# Altium footprint library ICs And Semiconductors THD.PcbLib: 350 footprints (part 16 of 22)
Each footprint in its own frame and in the unit in brackets; x right, y up, seen from the top. Pads: shape width x height; smd on the part's side, far side on the other; paste and mask are expansions set on the pad; w line width, h text height; cw(c..) or ccw(c..) is an arc to the next point about the centre after c.
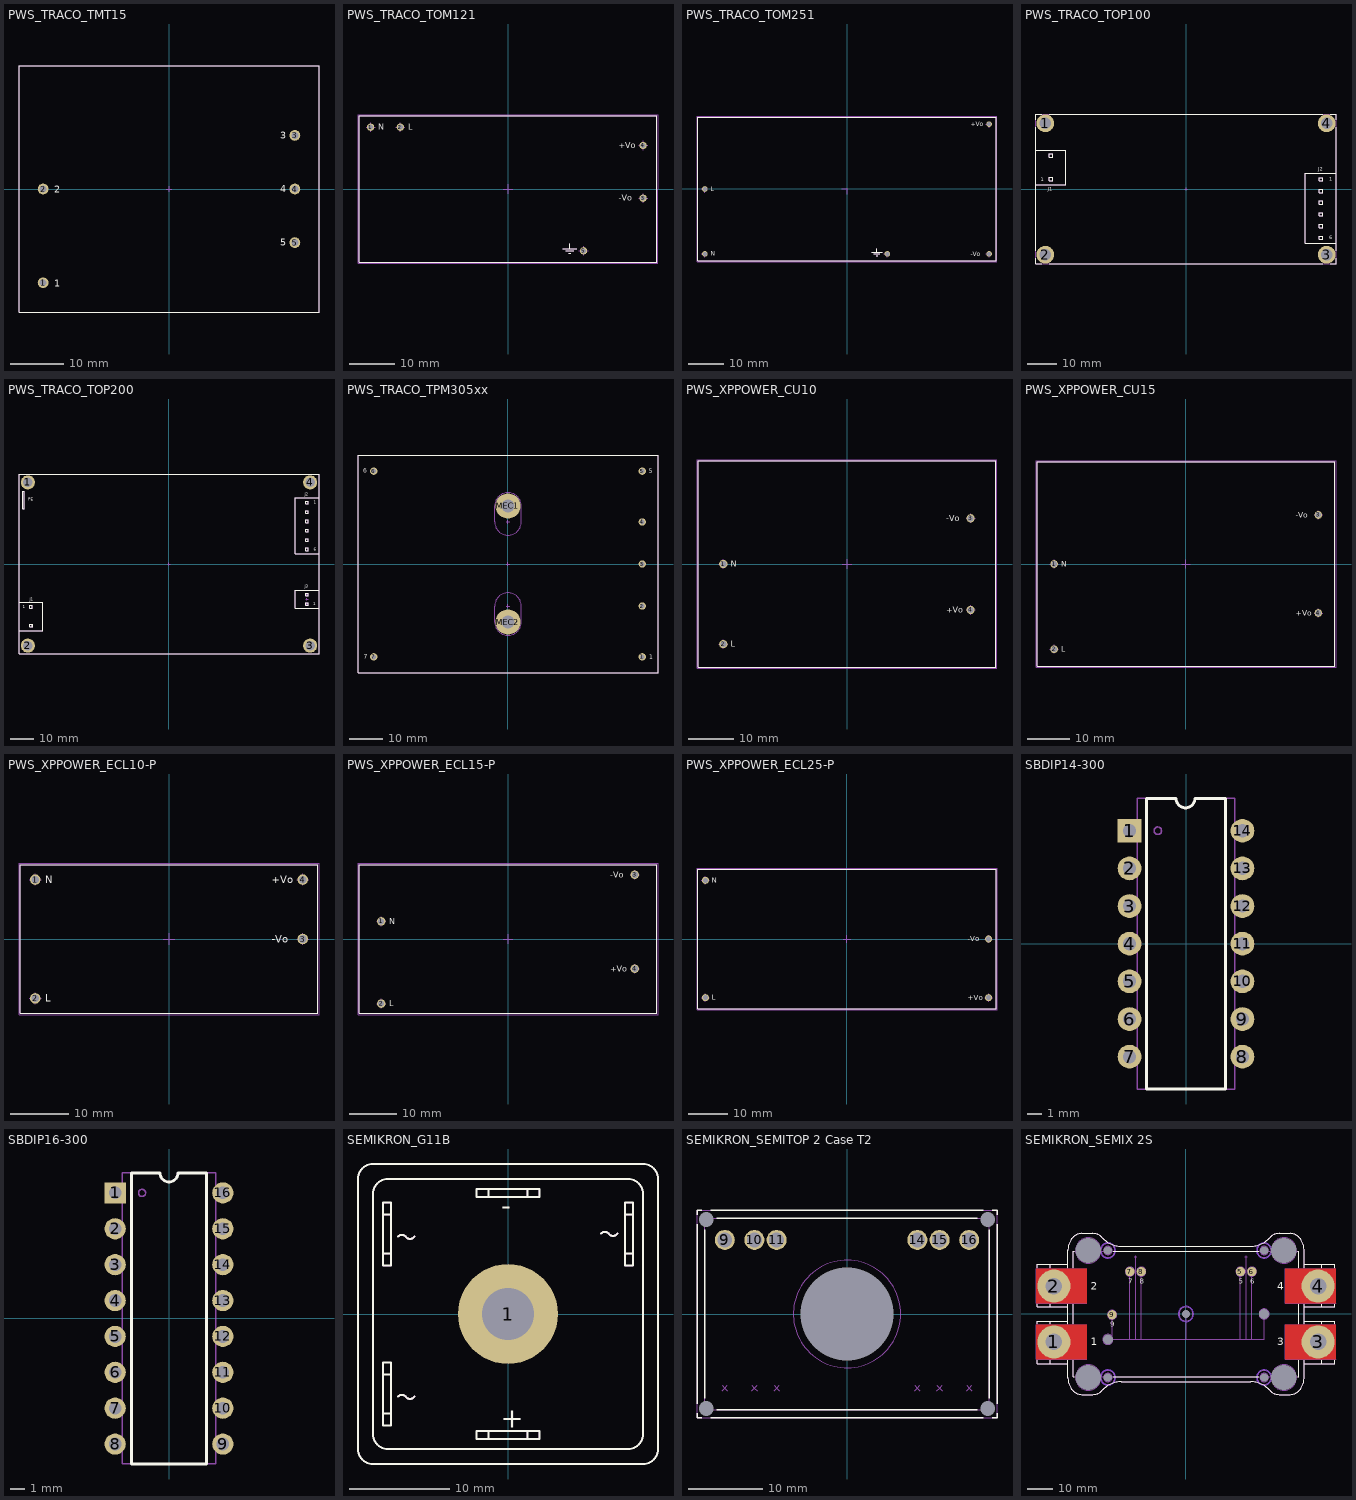
[diagram p15: the footprints below, top view; thin cyan lines are the x and y axes]

## PWS_TRACO_TMT15 [mm] "TMT  15W Model For PCB Mount, Body 55x45mm"
height 25
pads (5):
  round 2 hole 1.3: 1(-23.5,-17.5) 2(-23.5,0) 3(23.5,10) 4(23.5,0) 5(23.5,-10)
Top Overlay:
  lines w0.2: -28,-23 -28,23 28,23 28,-23 -28,-23
  text "1" at -21.42,-18.21 h1.27
  text "2" at -21.42,-0.71 h1.27
  text "5" at 20.72,-10.59 h1.27
  text "4" at 20.72,-0.59 h1.27
  text "3" at 20.72,9.41 h1.27
Notvisible:
  lines w0.1: -24,-17.5 -23.5,-17.5 ; -24,0 -23.5,0 ; -23.5,-18 -23.5,-17.5 ; -23.5,-17 -23.5,-17.5 ; -23.5,-0.5 -23.5,0 ; -23.5,0.5 -23.5,0 ; -23,-17.5 -23.5,-17.5 ; -23,0 -23.5,0 ; -0.5,0 0,0 ; 0,-0.5 0,0 ; 0,0.5 0,0 ; 0.5,0 0,0 ; 23,-10 23.5,-10 ; 23,0 23.5,0 ; 23,10 23.5,10 ; 23.5,-10.5 23.5,-10 ; 23.5,-9.5 23.5,-10 ; 23.5,-0.5 23.5,0 ; 23.5,0.5 23.5,0 ; 23.5,9.5 23.5,10 ; 23.5,10.5 23.5,10 ; 24,-10 23.5,-10 ; 24,0 23.5,0 ; 24,10 23.5,10
Mechanical 14:
  lines w0.1: -28,-23 28,-23 28,23 -28,23 -28,-23
  text "1" at -21.42,-18.21 h1.27
  text "2" at -21.42,-0.71 h1.27
  text "5" at 20.72,-10.59 h1.27
  text "4" at 20.72,-0.59 h1.27
  text "3" at 20.72,9.41 h1.27
3D body "PWS_TRACO_TMT15.stp": height 25, standoff -3.8, extent -28,-23 28,23

## PWS_TRACO_TOM121 [mm] "TOM12W Single Output Series , Body 65x32mm, Power Supply"
height 23
pads (5):
  round 1.6 hole 1.1: 1(-30,13.5) 2(-23.5,13.5) 3(29.5,-2) 4(29.5,9.5) 5(16.5,-13.5)
Top Overlay:
  lines w0.2: 12,-13 15,-13 ; 12.6,-13.5 14.4,-13.5 ; 13.3,-14 13.7,-14 ; 13.5,-13 13.5,-12 ; -32.5,-16 32.5,-16 32.5,16 -32.5,16 -32.5,-16
  text "N" at -28.325,12.91 h1.27
  text "L" at -21.825,12.91 h1.27
  text "+Vo" at 24.225,8.89 h1.27
  text "-Vo" at 24.225,-2.61 h1.27
Notvisible:
  lines w0.1: -31,13.5 -30,13.5 ; -30,12.5 -30,13.5 ; -30,14.5 -30,13.5 ; -29,13.5 -30,13.5 ; -24.5,13.5 -23.5,13.5 ; -23.5,12.5 -23.5,13.5 ; -23.5,14.5 -23.5,13.5 ; -22.5,13.5 -23.5,13.5 ; -1,0 0,0 ; 0,-1 0,0 ; 0,1 0,0 ; 1,0 0,0 ; 15.5,-13.5 16.5,-13.5 ; 16.5,-14.5 16.5,-13.5 ; 16.5,-12.5 16.5,-13.5 ; 17.5,-13.5 16.5,-13.5 ; 28.5,-2 29.5,-2 ; 28.5,9.5 29.5,9.5 ; 29.5,-3 29.5,-2 ; 29.5,-1 29.5,-2 ; 29.5,8.5 29.5,9.5 ; 29.5,10.5 29.5,9.5 ; 30.5,-2 29.5,-2 ; 30.5,9.5 29.5,9.5
Mechanical 14:
  lines w0.1: 12,-13 15,-13 ; 12.6,-13.5 14.4,-13.5 ; 13.3,-14 13.7,-14 ; 13.5,-13 13.5,-12 ; -32.5,-16 32.5,-16 32.5,16 -32.5,16 -32.5,-16
  text "N" at -28.325,12.91 h1.27
  text "L" at -21.825,12.91 h1.27
  text "+Vo" at 24.225,8.89 h1.27
  text "-Vo" at 24.225,-2.61 h1.27
Mechanical 15:
  lines w0.05: -32.75,-16.25 32.75,-16.25 32.75,16.25 -32.75,16.25 -32.75,-16.25
3D body: height 4.4, standoff -3, extent 29.101,9.101 29.9,9.899
3D body: height 4.4, standoff -3, extent 29.101,-2.399 29.9,-1.601
3D body: height 4.4, standoff -3, extent 16.101,-13.899 16.899,-13.101
3D body: height 4.4, standoff -3, extent -30.4,13.101 -29.601,13.899
3D body: height 4.4, standoff -3, extent -23.9,13.101 -23.101,13.899
3D body: height 23, standoff 4.4, extent -32.5,-16 32.5,16

## PWS_TRACO_TOM251 [mm] "TOM25W Single Output Series , Body 85x41mm, Power Supply"
height 29.5
pads (5):
  round 1.6 hole 1.1: 1(-40.5,-18.5) 2(-40.5,0) 3(40.5,-18.5) 4(40.5,18.5) 5(11.5,-18.5)
Top Overlay:
  lines w0.2: 7,-18 10,-18 ; 7.6,-18.5 9.4,-18.5 ; 8.3,-19 8.7,-19 ; 8.5,-18 8.5,-17 ; -42.5,-20.5 -42.5,20.5 42.5,20.5 42.5,-20.5 -42.5,-20.5
  text "-Vo" at 35.225,-19.11 h1.27
  text "+Vo" at 35.225,17.89 h1.27
  text "L" at -38.825,-0.59 h1.27
  text "N" at -38.825,-19.09 h1.27
Notvisible:
  lines w0.1: -41.5,-18.5 -40.5,-18.5 -40.5,-19.5 ; -41.5,0 -40.5,0 -40.5,-1 ; -1.5,0 0,0 0,-1.5 ; 10.5,-18.5 11.5,-18.5 11.5,-19.5 ; 39.5,-18.5 40.5,-18.5 40.5,-19.5 ; 39.5,18.5 40.5,18.5 40.5,17.5
Mechanical 14:
  lines w0.1: 7,-18 10,-18 ; 7.6,-18.5 9.4,-18.5 ; 8.3,-19 8.7,-19 ; 8.5,-18 8.5,-17 ; -42.5,-20.5 42.5,-20.5 42.5,20.5 -42.5,20.5 -42.5,-20.5
  text "N" at -38.825,-19.09 h1.27
  text "L" at -38.825,-0.59 h1.27
  text "+Vo" at 35.225,17.89 h1.27
  text "-Vo" at 35.225,-19.11 h1.27
Mechanical 15:
  lines w0.05: -42.75,-20.75 -42.75,20.75 42.75,20.75 42.75,-20.75 -42.75,-20.75
3D body: height 4.4, standoff -3, extent 40.101,18.101 40.899,18.899
3D body: height 4.4, standoff -3, extent 40.101,-18.899 40.899,-18.101
3D body: height 4.4, standoff -3, extent 11.101,-18.899 11.899,-18.101
3D body: height 4.4, standoff -3, extent -40.899,-18.899 -40.101,-18.101
3D body: height 4.4, standoff -3, extent -40.899,-0.399 -40.101,0.399
3D body: height 29.5, standoff 4.4, extent -42.5,-20.5 42.5,20.5

## PWS_TRACO_TOP100 [mm] "TOP 100 Serie 100W Power Supplies, Body 101.6 x 50.8mm"
height 33.2
pads (4):
  round 6 hole 4: 1(-47.65,22.25) 2(-47.65,-22.25) 3(47.65,-22.25) 4(47.65,22.25)
Top Overlay:
  lines w0.2: -50.8,-23.53 -50.8,-25.4 -48.93,-25.4 ; -50.8,-20.97 -50.8,20.97 ; -50.8,1.465 -40.792,1.465 -40.792,13.2 -50.8,13.2 ; -50.8,23.53 -50.8,25.4 -48.93,25.4 ; -46.37,-25.4 46.37,-25.4 ; -46.37,25.4 46.37,25.4 ; 48.93,-25.4 50.8,-25.4 50.8,-23.53 ; 48.93,25.4 50.8,25.4 50.8,23.53 ; 50.8,-20.97 50.8,20.97 ; 50.8,-3.16 50.8,-18.4 40.4,-18.4 40.4,5.34 50.8,5.34 ; -46.266,2.799 -46.266,3.942 -45.123,3.942 -45.123,2.799 -46.266,2.799 ; -46.266,10.724 -46.266,11.867 -45.123,11.867 -45.123,10.724 -46.266,10.724 ; 45.123,-17.067 45.123,-15.924 46.266,-15.924 46.266,-17.067 45.123,-17.067 ; 45.123,-13.104 45.123,-11.961 46.266,-11.961 46.266,-13.104 45.123,-13.104 ; 45.123,-9.142 45.123,-7.999 46.266,-7.999 46.266,-9.142 45.123,-9.142 ; 45.123,-5.179 45.123,-4.036 46.266,-4.036 46.266,-5.179 45.123,-5.179 ; 45.123,-1.217 45.123,-0.074 46.266,-0.074 46.266,-1.217 45.123,-1.217 ; 45.123,2.746 45.123,3.889 46.266,3.889 46.266,2.746 45.123,2.746
  text "1" at -49.141,2.644 h1.2
  text "6" at 48.525,-17.022 h1.2
  text "1" at 48.525,2.79 h1.2
  text "J2" at 44.775,6.19 h1.2
  text "J1" at -46.825,-0.51 h1.2
Notvisible:
  lines w0.1: -48.15,-22.25 -47.65,-22.25 ; -48.15,22.25 -47.65,22.25 ; -47.65,-22.75 -47.65,-22.25 ; -47.65,-21.75 -47.65,-22.25 ; -47.65,21.75 -47.65,22.25 ; -47.65,22.75 -47.65,22.25 ; -47.15,-22.25 -47.65,-22.25 ; -47.15,22.25 -47.65,22.25 ; -0.5,0 0,0 ; 0,-0.5 0,0 ; 0,0.5 0,0 ; 0.5,0 0,0 ; 47.15,-22.25 47.65,-22.25 ; 47.15,22.25 47.65,22.25 ; 47.65,-22.75 47.65,-22.25 ; 47.65,-21.75 47.65,-22.25 ; 47.65,21.75 47.65,22.25 ; 47.65,22.75 47.65,22.25 ; 48.15,-22.25 47.65,-22.25 ; 48.15,22.25 47.65,22.25
Mechanical 14:
  circle w0.1: c47.65,-22.25 r2
  circle w0.1: c47.65,22.25 r2
  circle w0.1: c-47.65,22.25 r2
  circle w0.1: c-47.65,-22.25 r2
  lines w0.1: -50.8,1.465 -40.792,1.465 -40.792,13.2 -50.8,13.2 ; 50.8,-18.4 40.4,-18.4 40.4,5.34 50.8,5.34 ; -50.8,-25.4 -50.8,25.4 50.8,25.4 50.8,-25.4 -50.8,-25.4 ; -46.266,2.799 -46.266,3.942 -45.123,3.942 -45.123,2.799 -46.266,2.799 ; -46.266,10.724 -46.266,11.867 -45.123,11.867 -45.123,10.724 -46.266,10.724 ; 45.123,-17.067 45.123,-15.924 46.266,-15.924 46.266,-17.067 45.123,-17.067 ; 45.123,-13.104 45.123,-11.961 46.266,-11.961 46.266,-13.104 45.123,-13.104 ; 45.123,-9.142 45.123,-7.999 46.266,-7.999 46.266,-9.142 45.123,-9.142 ; 45.123,-5.179 45.123,-4.036 46.266,-4.036 46.266,-5.179 45.123,-5.179 ; 45.123,-1.217 45.123,-0.074 46.266,-0.074 46.266,-1.217 45.123,-1.217 ; 45.123,2.746 45.123,3.889 46.266,3.889 46.266,2.746 45.123,2.746
  text "1" at -49.141,2.644 h1.2
  text "6" at 48.525,-17.022 h1.2
  text "1" at 48.525,2.79 h1.2
  text "J2" at 44.775,6.19 h1.2
  text "J1" at -46.825,-0.51 h1.2
3D body "PWS_TRACO_TOP100.stp": height 34.8, standoff -5.4, extent -50.8,-25.425 50.8,25.426

## PWS_TRACO_TOP200 [mm] "TOP 200 Serie 200W Power Supplies, Body 127 x 76.2mm"
height 35.4
pads (4):
  round 6 hole 4: 1(-59.75,34.55) 2(-59.75,-34.55) 3(59.75,-34.55) 4(59.75,34.55)
Top Overlay:
  lines w0.2: -63.5,-28.219 -53.492,-28.219 -53.492,-16.205 -63.5,-16.205 ; 56.236,4.293 63.5,4.318 53.492,4.318 53.492,27.975 63.5,27.975 ; 59.436,-18.8 57.214,-18.8 63.5,-18.8 ; 59.436,-11.028 57.214,-11.028 63.5,-11.028 ; 61.576,-18.8 63.5,-18.8 ; 61.576,-11.028 63.5,-11.028 ; -58.966,-26.607 -57.747,-26.607 -57.747,-25.464 -58.966,-25.464 ; -58.966,-26.607 -58.966,-25.464 ; -58.966,-26.607 -58.966,-25.464 ; -58.966,-26.607 -57.823,-26.607 -57.823,-25.464 -58.966,-25.464 ; -58.966,-18.682 -57.823,-18.682 ; -58.966,-18.682 -58.966,-17.539 ; -58.966,-18.682 -58.966,-17.539 ; -58.966,-18.682 -57.823,-18.682 ; -58.966,-17.539 -57.823,-17.539 ; -58.966,-17.539 -57.823,-17.539 ; -57.823,-18.682 -57.823,-17.539 ; -57.823,-18.682 -57.823,-17.539 ; 63.5,-18.8 53.492,-18.8 53.492,-11.028 63.5,-11.028 ; -63.5,-38.1 63.5,-38.1 63.5,38.1 -63.5,38.1 -63.5,-38.1 ; -62,23.307 -62,30.8 -61.2,30.8 -61.2,23.307 -62,23.307 ; 57.823,-17.467 57.823,-16.324 58.966,-16.324 58.966,-17.467 57.823,-17.467 ; 57.823,-13.504 57.823,-12.361 58.966,-12.361 58.966,-13.504 57.823,-13.504 ; 57.823,5.652 57.823,6.795 58.966,6.795 58.966,5.652 57.823,5.652 ; 57.823,9.614 57.823,10.757 58.966,10.757 58.966,9.614 57.823,9.614 ; 57.823,13.576 57.823,14.719 58.966,14.719 58.966,13.576 57.823,13.576 ; 57.823,17.539 57.823,18.682 58.966,18.682 58.966,17.539 57.823,17.539 ; 57.823,21.501 57.823,22.644 58.966,22.644 58.966,21.501 57.823,21.501 ; 57.823,25.464 57.823,26.607 58.966,26.607 58.966,25.464 57.823,25.464
  text "J2" at 57.475,28.908 h1.2
  text "1" at 61.225,25.508 h1.2
  text "6" at 61.225,5.696 h1.2
  text "J1" at -58.925,-15.515 h1.2
  text "1" at -61.841,-18.836 h1.2
  text "PE" at -59.659,26.691 h1.2
  text "J3" at 57.541,-10.109 h1.2
  text "1" at 61.025,-17.554 h1.2
Notvisible:
  lines w0.1: -60.25,-34.55 -59.75,-34.55 ; -60.25,34.55 -59.75,34.55 ; -59.75,-35.05 -59.75,-34.55 ; -59.75,-34.05 -59.75,-34.55 ; -59.75,34.05 -59.75,34.55 ; -59.75,35.05 -59.75,34.55 ; -59.25,-34.55 -59.75,-34.55 ; -59.25,34.55 -59.75,34.55 ; -0.5,0 0,0 ; 0,-0.5 0,0 ; 0,0.5 0,0 ; 0.5,0 0,0 ; 57.895,-16.895 58.395,-16.895 ; 57.895,-14.914 58.395,-14.914 ; 57.895,-12.933 58.395,-12.933 ; 58.395,-17.395 58.395,-16.895 ; 58.395,-16.395 58.395,-16.895 ; 58.395,-15.414 58.395,-14.914 ; 58.395,-14.414 58.395,-14.914 ; 58.395,-13.433 58.395,-12.933 ; 58.395,-12.433 58.395,-12.933 ; 58.895,-16.895 58.395,-16.895 ; 58.895,-14.914 58.395,-14.914 ; 58.895,-12.933 58.395,-12.933 ; 59.25,-34.55 59.75,-34.55 ; 59.25,34.55 59.75,34.55 ; 59.75,-35.05 59.75,-34.55 ; 59.75,-34.05 59.75,-34.55 ; 59.75,34.05 59.75,34.55 ; 59.75,35.05 59.75,34.55 ; 60.25,-34.55 59.75,-34.55 ; 60.25,34.55 59.75,34.55
Mechanical 14:
  circle w0.1: c59.75,34.55 r2
  circle w0.1: c59.75,-34.55 r2
  circle w0.1: c-59.75,-34.55 r2
  circle w0.1: c-59.75,34.55 r2
  lines w0.1: -63.5,-28.219 -53.492,-28.219 -53.492,-16.205 -63.5,-16.205 ; 56.236,4.293 63.5,4.318 53.492,4.318 53.492,27.975 63.5,27.975 ; 59.436,-18.8 57.214,-18.8 63.5,-18.8 ; 59.436,-11.028 57.214,-11.028 63.5,-11.028 ; 61.576,-18.8 63.5,-18.8 ; 61.576,-11.028 63.5,-11.028 ; -58.966,-26.607 -57.747,-26.607 -57.747,-25.464 -58.966,-25.464 ; -58.966,-26.607 -58.966,-25.464 ; -58.966,-26.607 -58.966,-25.464 ; -58.966,-26.607 -57.823,-26.607 -57.823,-25.464 -58.966,-25.464 ; -58.966,-18.682 -57.823,-18.682 ; -58.966,-18.682 -58.966,-17.539 ; -58.966,-18.682 -58.966,-17.539 ; -58.966,-18.682 -57.823,-18.682 ; -58.966,-17.539 -57.823,-17.539 ; -58.966,-17.539 -57.823,-17.539 ; -57.823,-18.682 -57.823,-17.539 ; -57.823,-18.682 -57.823,-17.539 ; 63.5,-18.8 53.492,-18.8 53.492,-11.028 63.5,-11.028 ; 63.5,-18.8 63.5,-11.028 ; -63.5,-38.1 63.5,-38.1 63.5,38.1 -63.5,38.1 -63.5,-38.1 ; -62,23.307 -62,30.8 -61.2,30.8 -61.2,23.307 -62,23.307 ; 57.823,-17.467 57.823,-16.324 58.966,-16.324 58.966,-17.467 57.823,-17.467 ; 57.823,-13.504 57.823,-12.361 58.966,-12.361 58.966,-13.504 57.823,-13.504 ; 57.823,5.652 57.823,6.795 58.966,6.795 58.966,5.652 57.823,5.652 ; 57.823,9.614 57.823,10.757 58.966,10.757 58.966,9.614 57.823,9.614 ; 57.823,13.576 57.823,14.719 58.966,14.719 58.966,13.576 57.823,13.576 ; 57.823,17.539 57.823,18.682 58.966,18.682 58.966,17.539 57.823,17.539 ; 57.823,21.501 57.823,22.644 58.966,22.644 58.966,21.501 57.823,21.501 ; 57.823,25.464 57.823,26.607 58.966,26.607 58.966,25.464 57.823,25.464
  text "J2" at 57.475,28.908 h1.2
  text "1" at 61.225,25.508 h1.2
  text "6" at 61.225,5.696 h1.2
  text "J1" at -58.925,-15.515 h1.2
  text "1" at -61.841,-18.836 h1.2
  text "PE" at -59.659,26.691 h1.2
  text "J3" at 57.541,-10.109 h1.2
  text "1" at 61.025,-17.554 h1.2
3D body "PWS_TRACO_TOP200.stp": height 35.4, standoff -5.4, extent -63.5,-38.1 63.5,38.1

## PWS_TRACO_TPM305xx [mm] "TPM  30/40W Model For PCB Mount, Body 90x65mm"
height 33.5
pads (9):
  round 2.2 hole 1.5: 1(40.5,-28) 2(40.5,-12.7) 3(40.5,0) 4(40.5,12.7) 5(40.5,28) 6(-40.5,28) 7(-40.5,-28)
  round 7.6 hole 3.8: MEC1(0,17.5) MEC2(0,-17.5)
Top Overlay:
  lines w0.2: -45.25,-32.75 45.25,-32.75 45.25,32.75 -45.25,32.75 -45.25,-32.75
  text "1" at 42.58,-28.71 h1.27
  text "6" at -43.72,27.46 h1.27
  text "7" at -43.52,-28.605 h1.27
  text "5" at 42.48,27.365 h1.27
Notvisible:
  lines w0.1: -41,-28 -40.5,-28 ; -41,28 -40.5,28 ; -40.5,-28.5 -40.5,-28 ; -40.5,-27.5 -40.5,-28 ; -40.5,27.5 -40.5,28 ; -40.5,28.5 -40.5,28 ; -40,-28 -40.5,-28 ; -40,28 -40.5,28 ; -0.5,-17.5 0,-17.5 ; -0.5,-12.7 0,-12.7 ; -0.5,0 0,0 ; -0.5,12.7 0,12.7 ; -0.5,17.5 0,17.5 ; 0,-18 0,-17.5 ; 0,-17 0,-17.5 ; 0,-13.2 0,-12.7 ; 0,-12.2 0,-12.7 ; 0,-0.5 0,0 ; 0,0.5 0,0 ; 0,12.2 0,12.7 ; 0,13.2 0,12.7 ; 0,17 0,17.5 ; 0,18 0,17.5 ; 0.5,-17.5 0,-17.5 ; 0.5,-12.7 0,-12.7 ; 0.5,0 0,0 ; 0.5,12.7 0,12.7 ; 0.5,17.5 0,17.5 ; 40,-28 40.5,-28 ; 40,-12.7 40.5,-12.7 ; 40,0 40.5,0 ; 40,12.7 40.5,12.7 ; 40,28 40.5,28 ; 40.5,-28.5 40.5,-28 ; 40.5,-27.5 40.5,-28 ; 40.5,-13.2 40.5,-12.7 ; 40.5,-12.2 40.5,-12.7 ; 40.5,-0.5 40.5,0 ; 40.5,0.5 40.5,0 ; 40.5,12.2 40.5,12.7 ; 40.5,13.2 40.5,12.7 ; 40.5,27.5 40.5,28 ; 40.5,28.5 40.5,28 ; 41,-28 40.5,-28 ; 41,-12.7 40.5,-12.7 ; 41,0 40.5,0 ; 41,12.7 40.5,12.7 ; 41,28 40.5,28 ; -4,-17.5 ccw(c0,-17.5) 4,-17.5 4,-12.7 ccw(c0,-12.7) -4,-12.7 -4,-17.5 ; -4,12.7 ccw(c0,12.7) 4,12.7 4,17.5 ccw(c0,17.5) -4,17.5 -4,12.7
Mechanical 14:
  lines w0.1: -45.25,-32.75 45.25,-32.75 45.25,32.75 -45.25,32.75 -45.25,-32.75
  text "1" at 42.58,-28.71 h1.27
  text "6" at -43.72,27.46 h1.27
  text "7" at -43.52,-28.605 h1.27
  text "5" at 42.48,27.365 h1.27
3D body "PWS_TRACO_TPM305xx.stp": height 33.5, standoff -3.6, extent -45.25,-32.75 45.25,32.75

## PWS_XPPOWER_CU10 [mm] "CU10 Series , Body 65.02x45mm, Power Supply"
height 23
pads (4):
  round 1.8 hole 1.3: 1(-27.01,0) 2(-27.01,-17.5) 3(26.99,9.98) 4(26.99,-10.03)
Top Overlay:
  lines w0.2: -32.51,-22.5 32.51,-22.5 32.51,22.5 -32.51,22.5 -32.51,-22.5
  text "-Vo" at 21.715,9.37 h1.27
  text "N" at -25.335,-0.59 h1.27
  text "L" at -25.335,-18.09 h1.27
  text "+Vo" at 21.715,-10.64 h1.27
Notvisible:
  lines w0.1: -28.01,-17.5 -27.01,-17.5 ; -28.01,0 -27.01,0 ; -27.01,-18.5 -27.01,-17.5 ; -27.01,-16.5 -27.01,-17.5 ; -27.01,-1 -27.01,0 ; -27.01,1 -27.01,0 ; -26.01,-17.5 -27.01,-17.5 ; -26.01,0 -27.01,0 ; -1,0 0,0 ; 0,-1 0,0 ; 0,1 0,0 ; 1,0 0,0 ; 25.99,-10.03 26.99,-10.03 ; 25.99,9.98 26.99,9.98 ; 26.99,-11.03 26.99,-10.03 ; 26.99,-9.03 26.99,-10.03 ; 26.99,8.98 26.99,9.98 ; 26.99,10.98 26.99,9.98 ; 27.99,-10.03 26.99,-10.03 ; 27.99,9.98 26.99,9.98
Mechanical 14:
  lines w0.1: -32.51,-22.5 32.51,-22.5 32.51,22.5 -32.51,22.5 -32.51,-22.5
  text "-Vo" at 21.715,9.37 h1.27
  text "N" at -25.335,-0.59 h1.27
  text "L" at -25.335,-18.09 h1.27
  text "+Vo" at 21.715,-10.64 h1.27
Mechanical 15:
  lines w0.05: -32.76,-22.75 32.76,-22.75 32.76,22.75 -32.76,22.75 -32.76,-22.75
3D body: height 23, standoff 4.4, extent -32.51,-22.5 32.51,22.5
3D body: height 0, standoff -3, extent 26.491,9.481 27.49,10.479
3D body: height 4.4, standoff 0, extent 26.091,9.081 27.89,10.879
3D body: height 0, standoff -3, extent 26.491,-10.529 27.49,-9.531
3D body: height 4.4, standoff 0, extent 26.091,-10.93 27.89,-9.131
3D body: height 0, standoff -3, extent -27.51,-0.499 -26.511,0.499
3D body: height 4.4, standoff 0, extent -27.91,-0.899 -26.111,0.899
3D body: height 0, standoff -3, extent -27.51,-18 -26.511,-17.001
3D body: height 4.4, standoff 0, extent -27.91,-18.4 -26.111,-16.601

## PWS_XPPOWER_CU15 [mm] "CU15 Series , Body 69.9x48mm, Power Supply"
height 23
pads (4):
  round 1.8 hole 1.3: 1(-30.95,0) 2(-30.95,-20) 3(31.05,11.51) 4(31.05,-11.5)
Top Overlay:
  lines w0.2: -34.95,-24 -34.95,24 34.95,24 34.95,-24 -34.95,-24
  text "-Vo" at 25.775,10.9 h1.27
  text "+Vo" at 25.775,-12.11 h1.27
  text "N" at -29.275,-0.59 h1.27
  text "L" at -29.275,-20.59 h1.27
Notvisible:
  lines w0.2: -31.95,-20 -30.95,-20 ; -31.95,0 -30.95,0 ; -30.95,-21 -30.95,-20 ; -30.95,-19 -30.95,-20 ; -30.95,-1 -30.95,0 ; -30.95,1 -30.95,0 ; -29.95,-20 -30.95,-20 ; -29.95,0 -30.95,0 ; -1,0 0,0 ; 0,-1 0,0 ; 0,1 0,0 ; 1,0 0,0 ; 30.05,-11.5 31.05,-11.5 ; 30.05,11.51 31.05,11.51 ; 31.05,-12.5 31.05,-11.5 ; 31.05,-10.5 31.05,-11.5 ; 31.05,10.51 31.05,11.51 ; 31.05,12.51 31.05,11.51 ; 32.05,-11.5 31.05,-11.5 ; 32.05,11.51 31.05,11.51
Mechanical 14:
  lines w0.1: -34.95,-24 -34.95,24 34.95,24 34.95,-24 -34.95,-24
  text "-Vo" at 25.775,10.9 h1.27
  text "+Vo" at 25.775,-12.11 h1.27
  text "N" at -29.275,-0.59 h1.27
  text "L" at -29.275,-20.59 h1.27
Mechanical 15:
  lines w0.05: -35.2,-24.25 -35.2,24.25 35.2,24.25 35.2,-24.25 -35.2,-24.25
3D body: height 23, standoff 4.4, extent -34.95,-24 34.95,24
3D body: height 0, standoff -3, extent 30.551,11.011 31.55,12.009
3D body: height 4.4, standoff 0, extent 30.151,10.611 31.95,12.41
3D body: height 0, standoff -3, extent 30.551,-11.999 31.55,-11.001
3D body: height 4.4, standoff 0, extent 30.151,-12.399 31.95,-10.601
3D body: height 0, standoff -3, extent -31.45,-20.5 -30.451,-19.501
3D body: height 4.4, standoff 0, extent -31.85,-20.9 -30.051,-19.101
3D body: height 0, standoff -3, extent -31.45,-0.499 -30.451,0.499
3D body: height 4.4, standoff 0, extent -31.85,-0.899 -30.051,0.899

## PWS_XPPOWER_ECL10-P [mm] "ECL10-P Series , Body 50.8x25.4mm, Power Supply"
height 22.86
pads (4):
  round 1.8 hole 1.3: 1(-22.86,10.16) 2(-22.86,-10.16) 3(22.86,0) 4(22.86,10.16)
Top Overlay:
  lines w0.2: -25.4,-12.7 -25.4,12.7 25.4,12.7 25.4,-12.7 -25.4,-12.7
  text "L" at -21.185,-10.75 h1.27
  text "N" at -21.185,9.57 h1.27
  text "-Vo" at 17.585,-0.61 h1.27
  text "+Vo" at 17.585,9.55 h1.27
Notvisible:
  lines w0.1: -23.86,-10.16 -22.86,-10.16 ; -23.86,10.16 -22.86,10.16 ; -22.86,-11.16 -22.86,-10.16 ; -22.86,-9.16 -22.86,-10.16 ; -22.86,9.16 -22.86,10.16 ; -22.86,11.16 -22.86,10.16 ; -21.86,-10.16 -22.86,-10.16 ; -21.86,10.16 -22.86,10.16 ; -1,0 0,0 ; 0,-1 0,0 ; 0,1 0,0 ; 1,0 0,0 ; 21.86,0 22.86,0 ; 21.86,10.16 22.86,10.16 ; 22.86,-1 22.86,0 ; 22.86,1 22.86,0 ; 22.86,9.16 22.86,10.16 ; 22.86,11.16 22.86,10.16 ; 23.86,0 22.86,0 ; 23.86,10.16 22.86,10.16
  lines w0.2: -23.86,-10.16 -22.86,-10.16 ; -23.86,10.16 -22.86,10.16 ; -22.86,-11.16 -22.86,-10.16 ; -22.86,-9.16 -22.86,-10.16 ; -22.86,9.16 -22.86,10.16 ; -22.86,11.16 -22.86,10.16 ; -21.86,-10.16 -22.86,-10.16 ; -21.86,10.16 -22.86,10.16 ; 21.86,0 22.86,0 ; 21.86,10.16 22.86,10.16 ; 22.86,-1 22.86,0 ; 22.86,1 22.86,0 ; 22.86,9.16 22.86,10.16 ; 22.86,11.16 22.86,10.16 ; 23.86,0 22.86,0 ; 23.86,10.16 22.86,10.16
Mechanical 14:
  lines w0.1: -25.4,-12.7 -25.4,12.7 25.4,12.7 25.4,-12.7 -25.4,-12.7
  text "L" at -21.185,-10.75 h1.27
  text "N" at -21.185,9.57 h1.27
  text "-Vo" at 17.585,-0.61 h1.27
  text "+Vo" at 17.585,9.55 h1.27
Mechanical 15:
  lines w0.05: -25.65,-12.95 25.65,-12.95 25.65,12.95 -25.65,12.95 -25.65,-12.95
3D body: height 0, standoff -3, extent -23.36,-10.659 -22.361,-9.661
3D body: height 4.4, standoff 0, extent -23.76,-11.059 -21.961,-9.261
3D body: height 0, standoff -3, extent -23.36,9.661 -22.361,10.659
3D body: height 4.4, standoff 0, extent -23.76,9.261 -21.961,11.06
3D body: height 0, standoff -3, extent 22.361,-0.499 23.36,0.499
3D body: height 4.4, standoff 0, extent 21.961,-0.899 23.76,0.899
3D body: height 0, standoff -3, extent 22.361,9.661 23.36,10.659
3D body: height 4.4, standoff 0, extent 21.961,9.261 23.76,11.06
3D body: height 22.86, standoff 4.4, extent -25.45,-12.75 25.45,12.75

## PWS_XPPOWER_ECL15-P [mm] "ECL15-P Series , Body 63.5x31.75mm, Power Supply"
height 25.4
pads (4):
  round 1.8 hole 1.3: 1(-27.05,3.755) 2(-27.05,-13.775) 3(27.05,13.715) 4(27.05,-6.355)
Top Overlay:
  lines w0.2: -31.75,-15.875 -31.75,15.875 31.75,15.875 31.75,-15.875 -31.75,-15.875
  text "L" at -25.375,-14.365 h1.27
  text "N" at -25.375,3.165 h1.27
  text "-Vo" at 21.775,13.105 h1.27
  text "+Vo" at 21.775,-6.965 h1.27
Notvisible:
  lines w0.1: -28.05,-13.775 -27.05,-13.775 ; -28.05,3.755 -27.05,3.755 ; -27.05,-14.775 -27.05,-13.775 ; -27.05,-12.775 -27.05,-13.775 ; -27.05,2.755 -27.05,3.755 ; -27.05,4.755 -27.05,3.755 ; -26.05,-13.775 -27.05,-13.775 ; -26.05,3.755 -27.05,3.755 ; -1,0 0,0 ; 0,-1 0,0 ; 0,1 0,0 ; 1,0 0,0 ; 26.05,-6.355 27.05,-6.355 ; 26.05,13.715 27.05,13.715 ; 27.05,-7.355 27.05,-6.355 ; 27.05,-5.355 27.05,-6.355 ; 27.05,12.715 27.05,13.715 ; 27.05,14.715 27.05,13.715 ; 28.05,-6.355 27.05,-6.355 ; 28.05,13.715 27.05,13.715
Mechanical 14:
  lines w0.1: -31.75,-15.875 -31.75,15.875 31.75,15.875 31.75,-15.875 -31.75,-15.875
  text "L" at -25.375,-14.365 h1.27
  text "N" at -25.375,3.165 h1.27
  text "-Vo" at 21.775,13.105 h1.27
  text "+Vo" at 21.775,-6.965 h1.27
Mechanical 15:
  lines w0.05: -32,-16.125 32,-16.125 32,16.125 -32,16.125 -32,-16.125
3D body: height 4.4, standoff 0, extent -27.95,2.856 -26.151,4.654
3D body: height 0, standoff -3, extent -27.55,3.256 -26.551,4.254
3D body: height 4.4, standoff 0, extent -27.95,-14.674 -26.151,-12.876
3D body: height 0, standoff -3, extent -27.55,-14.274 -26.551,-13.276
3D body: height 4.4, standoff 0, extent 26.151,-7.254 27.95,-5.456
3D body: height 0, standoff -3, extent 26.551,-6.854 27.55,-5.856
3D body: height 4.4, standoff 0, extent 26.151,12.816 27.95,14.614
3D body: height 0, standoff -3, extent 26.551,13.216 27.55,14.214
3D body: height 25.4, standoff 4.4, extent -31.75,-15.874 31.75,15.875

## PWS_XPPOWER_ECL25-P [mm] "ECL25-P Series , Body 76.2x35.6mm, Power Supply"
height 26.7
pads (4):
  round 1.8 hole 1.3: 1(-36.2,15) 2(-36.2,-15) 3(36.195,0) 4(36.2,-15)
Top Overlay:
  lines w0.2: -38.1,-17.8 38.1,-17.8 38.1,17.8 -38.1,17.8 -38.1,-17.8
  text "+Vo" at 30.925,-15.61 h1.27
  text "-Vo" at 30.92,-0.61 h1.27
  text "N" at -34.525,14.41 h1.27
  text "L" at -34.525,-15.59 h1.27
Notvisible:
  lines w0.1: -37.2,-15 -36.2,-15 ; -37.2,15 -36.2,15 ; -36.2,-16 -36.2,-15 ; -36.2,-14 -36.2,-15 ; -36.2,14 -36.2,15 ; -36.2,16 -36.2,15 ; -35.2,-15 -36.2,-15 ; -35.2,15 -36.2,15 ; -1,0 0,0 ; 0,-1 0,0 ; 0,1 0,0 ; 1,0 0,0 ; 35.195,0 36.195,0 ; 35.2,-15 36.2,-15 ; 36.195,-1 36.195,0 ; 36.195,1 36.195,0 ; 36.2,-16 36.2,-15 ; 36.2,-14 36.2,-15 ; 37.195,0 36.195,0 ; 37.2,-15 36.2,-15
Mechanical 14:
  lines w0.1: -38.1,-17.8 38.1,-17.8 38.1,17.8 -38.1,17.8 -38.1,-17.8
  text "+Vo" at 30.925,-15.61 h1.27
  text "-Vo" at 30.92,-0.61 h1.27
  text "N" at -34.525,14.41 h1.27
  text "L" at -34.525,-15.59 h1.27
Mechanical 15:
  lines w0.05: -38.35,-18.05 38.35,-18.05 38.35,18.05 -38.35,18.05 -38.35,-18.05
3D body: height 0, standoff -3, extent 35.701,-0.499 36.7,0.499
3D body: height 4.4, standoff 0, extent 35.301,-0.899 37.1,0.899
3D body: height 0, standoff -3, extent 35.701,-15.499 36.7,-14.501
3D body: height 4.4, standoff 0, extent 35.301,-15.9 37.1,-14.101
3D body: height 0, standoff -3, extent -36.7,-15.499 -35.701,-14.501
3D body: height 4.4, standoff 0, extent -37.1,-15.9 -35.301,-14.101
3D body: height 0, standoff -3, extent -36.7,14.501 -35.701,15.499
3D body: height 4.4, standoff 0, extent -37.1,14.101 -35.301,15.9
3D body: height 26.7, standoff 4.4, extent -38.2,-17.9 38.2,17.9

## SBDIP14-300 [mm] "Side-Brazed Ceramic Dual In-Line Package (SBDIP) 14 Leads, Row Spacing 7.62 mm; Pitch 2.54 mm"
height 5.08
pads (14):
  rect 1.6x1.6 hole 0.9: 1(-3.81,7.62)
  round 1.6 hole 0.9: 2(-3.81,5.08) 3(-3.81,2.54) 4(-3.81,0) 5(-3.81,-2.54) 6(-3.81,-5.08) 7(-3.81,-7.62) 8(3.81,-7.62) 9(3.81,-5.08) 10(3.81,-2.54) 11(3.81,0) 12(3.81,2.54) 13(3.81,5.08) 14(3.81,7.62)
Top Overlay:
  lines w0.2: -0.685,9.8 -2.65,9.8 -2.65,-9.8 2.65,-9.8 2.65,9.8 ; -0.67,9.8 ccw(c-0.035,9.8) 0.6,9.8 2.615,9.8
Mechanical 14:
  circle w0.1: c-1.905,7.62 r0.254
  lines w0.1: -3.3,-9.8 3.3,-9.8 3.3,9.8 0.6,9.8 cw(c-0.035,9.8) -0.67,9.8 -3.3,9.8 -3.3,-9.8
3D body "SBDIP14-300.stp": height 5.08, standoff -3.81, extent -4.125,-9.715 4.125,9.715

## SBDIP16-300 [mm] "Side-Brazed Ceramic Dual In-Line Package (SBDIP) 16 Leads, Row Spacing 7.62 mm; Pitch 2.54 mm"
height 4.45
pads (16):
  rect 1.5x1.5 hole 0.9: 1(-3.81,8.89)
  round 1.5 hole 0.9: 2(-3.81,6.35) 3(-3.81,3.81) 4(-3.81,1.27) 5(-3.81,-1.27) 6(-3.81,-3.81) 7(-3.81,-6.35) 8(-3.81,-8.89) 9(3.81,-8.89) 10(3.81,-6.35) 11(3.81,-3.81) 12(3.81,-1.27) 13(3.81,1.27) 14(3.81,3.81) 15(3.81,6.35) 16(3.81,8.89)
Top Overlay:
  lines w0.2: -2.65,-10.3 2.65,-10.3 2.65,10.3 0.635,10.3 cw(c0,10.3) -0.635,10.3 -2.65,10.3 -2.65,-10.3
Mechanical 14:
  circle w0.1: c-1.905,8.89 r0.254
  lines w0.1: -3.3,-10.3 -3.3,10.3 -0.67,10.3 ccw(c-0.035,10.3) 0.6,10.3 3.3,10.3 3.3,-10.3 -3.3,-10.3
3D body "SBDIP16-300.stp": height 4.55, standoff -3.81, extent -4.125,-10.285 4.125,10.285

## SEMIKRON_G11B [mm] "Three Phase Bridge Bridge, Body 28.8mm x 28.8mm G11b Case"
height 22.5
pads (1):
  round 10 hole 5.2: 1(0,0)
Top Overlay:
  lines w0.2: -12.5,-9.95 -11.7,-9.95 ; -12.5,-6.05 -11.7,-6.05 ; -12.5,6.05 -11.7,6.05 ; -12.5,9.95 -11.7,9.95 ; -10.975,-8.232 cw(c-10.615,-8.579) -10.2,-8.3 ; -10.975,7.768 cw(c-10.615,7.421) -10.2,7.7 ; -10.175,-8.32 ccw(c-9.794,-7.996) -9.365,-8.254 ; -10.175,7.68 ccw(c-9.794,8.004) -9.365,7.746 ; -1.95,-12.5 -1.95,-11.7 ; -1.95,11.7 -1.95,12.5 ; 1.95,-12.5 1.95,-11.7 ; 1.95,11.7 1.95,12.5 ; 9.325,8.068 cw(c9.685,7.721) 10.1,8 ; 10.125,7.98 ccw(c10.506,8.304) 10.935,8.046 ; 11.7,6.05 12.5,6.05 ; 11.7,9.95 12.5,9.95 ; -15,-13.5 ccw(c-13.5,-13.5) -13.5,-15 13.5,-15 ccw(c13.5,-13.5) 15,-13.5 15,13.5 ccw(c13.5,13.5) 13.5,15 -13.5,15 ccw(c-13.5,13.5) -15,13.5 -15,-13.5 ; -13.5,-12 ccw(c-12,-12) -12,-13.5 12,-13.5 ccw(c12,-12) 13.5,-12 13.5,12 ccw(c12,12) 12,13.5 -12,13.5 ccw(c-12,12) -13.5,12 -13.5,-12 ; -12.5,-11.15 -12.5,-4.85 -11.7,-4.85 -11.7,-11.15 -12.5,-11.15 ; -12.5,4.85 -12.5,11.15 -11.7,11.15 -11.7,4.85 -12.5,4.85 ; -3.15,-12.5 3.15,-12.5 3.15,-11.7 -3.15,-11.7 -3.15,-12.5 ; -3.15,11.7 3.15,11.7 3.15,12.5 -3.15,12.5 -3.15,11.7 ; 11.7,4.85 11.7,11.15 12.5,11.15 12.5,4.85 11.7,4.85
  text "-" at -0.7,9.9 h2
  text "+" at -0.7,-11.4 h2
Notvisible:
  lines w0.1: -1,0 0,0 ; 0,-1 0,0 ; 0,1 0,0 ; 1,0 0,0
Mechanical 14:
  circle w0.1: c0,0 r2.6
  circle w0.1: c0,0 r4.1
  circle w0.1: c0,0 r2.6
  lines w0.1: -12.5,-9.95 -11.7,-9.95 ; -12.5,-6.05 -11.7,-6.05 ; -12.5,6.05 -11.7,6.05 ; -12.5,9.95 -11.7,9.95 ; -1.95,-12.5 -1.95,-11.7 ; -1.95,11.7 -1.95,12.5 ; 1.95,-12.5 1.95,-11.7 ; 1.95,11.7 1.95,12.5 ; 11.7,6.05 12.5,6.05 ; 11.7,9.95 12.5,9.95 ; -15,-13.5 ccw(c-13.5,-13.5) -13.5,-15 13.5,-15 ccw(c13.5,-13.5) 15,-13.5 15,13.5 ccw(c13.5,13.5) 13.5,15 -13.5,15 ccw(c-13.5,13.5) -15,13.5 -15,-13.5 ; -13.5,-12 ccw(c-12,-12) -12,-13.5 12,-13.5 ccw(c12,-12) 13.5,-12 13.5,12 ccw(c12,12) 12,13.5 -12,13.5 ccw(c-12,12) -13.5,12 -13.5,-12 ; -12.5,-11.15 -12.5,-4.85 -11.7,-4.85 -11.7,-11.15 -12.5,-11.15 ; -12.5,4.85 -12.5,11.15 -11.7,11.15 -11.7,4.85 -12.5,4.85 ; -3.15,-12.5 3.15,-12.5 3.15,-11.7 -3.15,-11.7 -3.15,-12.5 ; -3.15,11.7 3.15,11.7 3.15,12.5 -3.15,12.5 -3.15,11.7 ; 11.7,4.85 11.7,11.15 12.5,11.15 12.5,4.85 11.7,4.85
  lines w0.2: -10.975,-8.232 cw(c-10.615,-8.579) -10.2,-8.3 ; -10.975,-8.232 cw(c-10.615,-8.579) -10.2,-8.3 ; -10.975,-8.232 cw(c-10.615,-8.579) -10.2,-8.3 ; -10.975,7.768 cw(c-10.615,7.421) -10.2,7.7 ; -10.975,7.768 cw(c-10.615,7.421) -10.2,7.7 ; -10.975,7.768 cw(c-10.615,7.421) -10.2,7.7 ; -10.175,-8.32 ccw(c-9.794,-7.996) -9.365,-8.254 ; -10.175,-8.32 ccw(c-9.794,-7.996) -9.365,-8.254 ; -10.175,-8.32 ccw(c-9.794,-7.996) -9.365,-8.254 ; -10.175,7.68 ccw(c-9.794,8.004) -9.365,7.746 ; -10.175,7.68 ccw(c-9.794,8.004) -9.365,7.746 ; -10.175,7.68 ccw(c-9.794,8.004) -9.365,7.746 ; 9.325,8.068 cw(c9.685,7.721) 10.1,8 ; 9.325,8.068 cw(c9.685,7.721) 10.1,8 ; 9.325,8.068 cw(c9.685,7.721) 10.1,8 ; 10.125,7.98 ccw(c10.506,8.304) 10.935,8.046 ; 10.125,7.98 ccw(c10.506,8.304) 10.935,8.046 ; 10.125,7.98 ccw(c10.506,8.304) 10.935,8.046
  text "-" at -0.7,9.9 h2
  text "+" at -0.7,-11.4 h2
  text "+" at -0.7,-11.4 h2
  text "-" at -0.7,9.9 h2
  text "-" at -0.7,9.9 h2
  text "+" at -0.7,-11.4 h2
3D body "SEMIKRON_CASE G11B.stp": height 22.5, standoff 0, extent -15,-15 15,15

## SEMIKRON_SEMITOP 2 Case T2 [mm] "SEMIKRON SEMITOP 2 Case T2"
height 10.5
pads (11):
  round 2.7 hole 2: 9(-16.5,10) 10(-12.5,10) 11(-9.5,10) 14(9.5,10) 15(12.5,10) 16(16.5,10)
  round 1 hole 2 unplated mask+0.5: MECH1(-19,12.75) MECH2(-19,-12.75) MECH3(19,-12.75) MECH4(19,12.75)
  round 1 hole 12.5 unplated mask+5.75: MECH5(0,0)
Top Overlay:
  lines w0.2: -20.25,-13.38 -20.25,-14 -19.63,-14 ; -20.25,-12.12 -20.25,12.12 ; -20.25,13.38 -20.25,14 -19.63,14 ; -19.2,-11.364 -19.2,11.364 ; -18.37,-14 18.37,-14 ; -18.37,14 18.37,14 ; -17.614,-12.95 17.614,-12.95 ; -17.614,12.95 17.614,12.95 ; 19.2,-11.364 19.2,11.364 ; 19.63,-14 20.25,-14 20.25,-13.38 ; 19.63,14 20.25,14 20.25,13.38 ; 20.25,-12.12 20.25,12.12
Notvisible:
  circle w0.1: c0,0 r6
  circle w0.1: c0,0 r7.25
  lines w0.1: -19.5,-12.75 -19,-12.75 ; -19.5,12.75 -19,12.75 ; -19,-13.25 -19,-12.75 ; -19,-12.25 -19,-12.75 ; -19,12.25 -19,12.75 ; -19,13.25 -19,12.75 ; -18.5,-12.75 -19,-12.75 ; -18.5,12.75 -19,12.75 ; -17,10 -16.5,10 ; -16.854,-10.354 -16.5,-10 ; -16.854,-9.646 -16.5,-10 ; -16.5,9.5 -16.5,10 ; -16.5,10.5 -16.5,10 ; -16.146,-10.354 -16.5,-10 ; -16.146,-9.646 -16.5,-10 ; -16,10 -16.5,10 ; -13,10 -12.5,10 ; -12.854,-10.354 -12.5,-10 ; -12.854,-9.646 -12.5,-10 ; -12.5,9.5 -12.5,10 ; -12.5,10.5 -12.5,10 ; -12.146,-10.354 -12.5,-10 ; -12.146,-9.646 -12.5,-10 ; -12,10 -12.5,10 ; -10,10 -9.5,10 ; -9.854,-10.354 -9.5,-10 ; -9.854,-9.646 -9.5,-10 ; -9.5,9.5 -9.5,10 ; -9.5,10.5 -9.5,10 ; -9.146,-10.354 -9.5,-10 ; -9.146,-9.646 -9.5,-10 ; -9,10 -9.5,10 ; 9,10 9.5,10 ; 9.146,-10.354 9.5,-10 ; 9.146,-9.646 9.5,-10 ; 9.5,9.5 9.5,10 ; 9.5,10.5 9.5,10 ; 9.854,-10.354 9.5,-10 ; 9.854,-9.646 9.5,-10 ; 10,10 9.5,10 ; 12,10 12.5,10 ; 12.146,-10.354 12.5,-10 ; 12.146,-9.646 12.5,-10 ; 12.5,9.5 12.5,10 ; 12.5,10.5 12.5,10 ; 12.854,-10.354 12.5,-10 ; 12.854,-9.646 12.5,-10 ; 13,10 12.5,10 ; 16,10 16.5,10 ; 16.146,-10.354 16.5,-10 ; 16.146,-9.646 16.5,-10 ; 16.5,9.5 16.5,10 ; 16.5,10.5 16.5,10 ; 16.854,-10.354 16.5,-10 ; 16.854,-9.646 16.5,-10 ; 17,10 16.5,10 ; 18.5,-12.75 19,-12.75 ; 18.5,12.75 19,12.75 ; 19,-13.25 19,-12.75 ; 19,-12.25 19,-12.75 ; 19,12.25 19,12.75 ; 19,13.25 19,12.75 ; 19.5,-12.75 19,-12.75 ; 19.5,12.75 19,12.75 ; 0,0 0.5,0 0,0 ; 0,0 0,0.5 0,0 ; 0,0 -0.5,0 0,0 ; 0,0 0,-0.5 0,0
Mechanical 14:
  circle w0.1: c0,0 r2.2
  lines w0.1: -20.25,-14 -20.25,14 20.25,14 20.25,-14 -20.25,-14 ; -19.2,-12.95 -19.2,12.95 19.2,12.95 19.2,-12.95 -19.2,-12.95
3D body "SEMIKRON_SEMITOP 2 Case T2.stp": height 12, standoff -3.5, extent -20.25,-14 20.25,14

## SEMIKRON_SEMIX 2S [mm] "SEMIKRON SEMIX 2s Case"
height 17.5
pads (20):
  round 13 hole 6.5: 1(-52,-11) 2(-52,11) 3(52,-11) 4(52,11)
  round 3.6 smd: 5(21.45,16.7) 6(25.95,16.7) 7(-22.1,16.7) 8(-17.6,16.7) 9(-29.1,-0.3)
  round 1 hole 3.3 unplated mask+1.15: 10(-30.75,25) 11(-30.75,-25) 12(30.75,-25) 13(30.75,25) 14(0,0)
  round 1 hole 4 unplated mask+1.5: 15(-30.75,-10) 16(30.75,0)
  round 1 hole 10 unplated mask+4.5: 17(-38.5,25) 18(-38.5,-25) 19(38.5,-25) 20(38.5,25)
Top Layer:
  region: 39.05,-17.75 59.05,-17.75 59.05,-4.25 39.05,-4.25
  region: 39.05,4.25 59.05,4.25 59.05,17.75 39.05,17.75
  region: -59.05,-17.75 -39.05,-17.75 -39.05,-4.25 -59.05,-4.25
  region: -59.05,4.25 -39.05,4.25 -39.05,17.75 -59.05,17.75
Bottom Layer keep-out:
  circle w0.1: c0,0 r3
  circle w0.1: c-30.75,-25 r3
  circle w0.1: c30.75,-25 r3
  circle w0.1: c30.75,25 r3
  circle w0.1: c-30.75,25 r3
Top Overlay:
  lines w0.2: -58.5,-18.15 -58.5,-19.5 -46.5,-19.5 ; -58.5,-3.85 -58.5,-2.8 -46.5,-2.8 ; -58.5,3.85 -58.5,2.8 -46.5,2.8 ; -58.5,18.15 -58.5,19.5 -46.5,19.5 ; -53.5,-19.5 -53.5,-18.15 ; -53.5,-3.85 -53.5,-2.8 ; -53.5,2.8 -53.5,3.85 ; -53.5,18.15 -53.5,19.5 ; -46.5,-18.15 -46.5,-25 ccw(c-38.5,-25) -45.092,-29.533 ccw(c-40.972,-26.7) -40.972,-31.7 -36.68,-31.7 ccw(c-36.68,-26.7) -32.954,-30.033 cw(c-25.5,-36.7) -25.5,-26.7 25.5,-26.7 cw(c25.5,-36.7) 32.954,-30.033 ccw(c36.68,-26.7) 36.68,-31.7 40.972,-31.7 ccw(c40.972,-26.7) 45.092,-29.533 ccw(c38.5,-25) 46.5,-25 46.5,-18.15 ; -46.5,-3.85 -46.5,3.85 ; -46.5,18.15 -46.5,25 cw(c-38.5,25) -45.092,29.533 cw(c-40.972,26.7) -40.972,31.7 -36.68,31.7 cw(c-36.68,26.7) -32.954,30.033 ccw(c-25.5,36.7) -25.5,26.7 25.5,26.7 ccw(c25.5,36.7) 32.954,30.033 cw(c36.68,26.7) 36.68,31.7 40.972,31.7 cw(c40.972,26.7) 45.092,29.533 cw(c38.5,25) 46.5,25 46.5,18.15 ; -44.45,-18.15 -44.45,-24.8 -43.996,-24.8 ; -44.45,-3.85 -44.45,3.85 ; -44.45,18.15 -44.45,24.8 -43.996,24.8 ; -28.71,-24.8 28.71,-24.8 ; -28.71,24.8 28.71,24.8 ; 43.996,-24.8 44.45,-24.8 44.45,-18.15 ; 43.996,24.8 44.45,24.8 44.45,18.15 ; 44.45,-3.85 44.45,3.85 ; 46.5,-19.5 58.5,-19.5 58.5,-18.15 ; 46.5,-3.85 46.5,3.85 ; 46.5,-2.8 58.5,-2.8 58.5,-3.85 ; 46.5,2.8 58.5,2.8 58.5,3.85 ; 46.5,19.5 58.5,19.5 58.5,18.15 ; 53.5,-19.5 53.5,-18.15 ; 53.5,-3.85 53.5,-2.8 ; 53.5,2.8 53.5,3.85 ; 53.5,18.15 53.5,19.5
  text "9" at -29.8,-5.075 h2
  text "3" at 35.975,-12.3 h3
  text "4" at 35.952,9.5 h3
  text "1" at -37.413,-12.4 h3
  text "2" at -37.5,9.5 h3
  text "6" at 25.25,11.925 h2
  text "5" at 20.75,11.925 h2
  text "8" at -18.259,11.925 h2
  text "7" at -22.81,11.925 h2
Notvisible:
  circle w0.1: c-38.5,25 r5
  circle w0.1: c-38.5,-25 r5
  circle w0.1: c38.5,-25 r5
  circle w0.1: c38.5,25 r5
  circle w0.1: c-29.1,-0.3 r1.8
  circle w0.1: c25.95,16.7 r1.8
  circle w0.1: c21.45,16.7 r1.8
  circle w0.1: c-17.6,16.7 r1.8
  circle w0.1: c-22.1,16.7 r1.8
  circle w0.1: c-30.75,25 r1.65
  circle w0.1: c30.75,25 r1.65
  circle w0.1: c30.75,-25 r1.65
  circle w0.1: c-30.75,-25 r1.65
  circle w0.1: c-30.75,-10 r2
  circle w0.1: c30.75,0 r2
  circle w0.1: c-52,11 r3.25
  circle w0.1: c-52,-11 r3.25
  circle w0.1: c52,-11 r3.25
  circle w0.1: c52,11 r3.25
  circle w0.1: c30.75,-25 r2.75
  circle w0.1: c-30.75,-25 r2.75
  circle w0.1: c-30.75,25 r2.75
  circle w0.1: c30.75,25 r2.75
  circle w0.1: c0,0 r2.75
  lines w0.1: -52.5,-11 -52,-11 ; -52.5,11 -52,11 ; -52,-11.5 -52,-11 ; -52,-10.5 -52,-11 ; -52,10.5 -52,11 ; -52,11.5 -52,11 ; -51.5,-11 -52,-11 ; -51.5,11 -52,11 ; -39,-25 -38.5,-25 ; -39,25 -38.5,25 ; -38.5,-25.5 -38.5,-25 ; -38.5,-24.5 -38.5,-25 ; -38.5,24.5 -38.5,25 ; -38.5,25.5 -38.5,25 ; -38,-25 -38.5,-25 ; -38,25 -38.5,25 ; -31.25,-25 -30.75,-25 ; -31.25,-10 -30.75,-10 ; -31.25,25 -30.75,25 ; -30.75,-25.5 -30.75,-25 ; -30.75,-24.5 -30.75,-25 ; -30.75,-10.5 -30.75,-10 ; -30.75,-9.5 -30.75,-10 ; -30.75,24.5 -30.75,25 ; -30.75,25.5 -30.75,25 ; -30.25,-25 -30.75,-25 ; -30.25,-10 -30.75,-10 ; -30.25,25 -30.75,25 ; -29.6,-0.3 -29.1,-0.3 ; -29.1,-10 -29.1,-0.3 ; -29.1,-0.8 -29.1,-0.3 ; -29.1,0.2 -29.1,-0.3 ; -28.6,-0.3 -29.1,-0.3 ; -22.6,16.7 -22.1,16.7 ; -22.1,-10 -22.1,16.7 ; -22.1,16.2 -22.1,16.7 ; -22.1,17.2 -22.1,16.7 ; -21.6,16.7 -22.1,16.7 ; -20.35,22.45 -19.85,22.45 ; -19.85,-10 -19.85,22.45 ; -19.85,21.95 -19.85,22.45 ; -19.85,22.95 -19.85,22.45 ; -19.35,22.45 -19.85,22.45 ; -18.1,16.7 -17.6,16.7 ; -17.6,-10 -17.6,16.7 ; -17.6,16.2 -17.6,16.7 ; -17.6,17.2 -17.6,16.7 ; -17.1,16.7 -17.6,16.7 ; -0.5,0 0,0 ; 0,-10 0,0 ; 0,-0.5 0,0 ; 0,0.5 0,0 ; 0.5,0 0,0 ; 20.95,16.7 21.45,16.7 ; 21.45,-10 21.45,16.7 ; 21.45,16.2 21.45,16.7 ; 21.45,17.2 21.45,16.7 ; 21.95,16.7 21.45,16.7 ; 23.2,22.45 23.7,22.45 ; 23.7,-10 23.7,22.45 ; 23.7,21.95 23.7,22.45 ; 23.7,22.95 23.7,22.45 ; 24.2,22.45 23.7,22.45 ; 25.45,16.7 25.95,16.7 ; 25.95,-10 25.95,16.7 ; 25.95,16.2 25.95,16.7 ; 25.95,17.2 25.95,16.7 ; 26.45,16.7 25.95,16.7 ; 30.25,-25 30.75,-25 ; 30.25,0 30.75,0 ; 30.25,25 30.75,25 ; 30.75,-25.5 30.75,-25 ; 30.75,-24.5 30.75,-25 ; 30.75,-0.5 30.75,0 ; 30.75,0.5 30.75,0 ; 30.75,24.5 30.75,25 ; 30.75,25.5 30.75,25 ; 31.25,-25 30.75,-25 ; 31.25,0 30.75,0 ; 31.25,25 30.75,25 ; 38,-25 38.5,-25 ; 38,25 38.5,25 ; 38.5,-25.5 38.5,-25 ; 38.5,-24.5 38.5,-25 ; 38.5,24.5 38.5,25 ; 38.5,25.5 38.5,25 ; 39,-25 38.5,-25 ; 39,25 38.5,25 ; 51.5,-11 52,-11 ; 51.5,11 52,11 ; 52,-11.5 52,-11 ; 52,-10.5 52,-11 ; 52,10.5 52,11 ; 52,11.5 52,11 ; 52.5,-11 52,-11 ; 52.5,11 52,11 ; -59.05,-17.75 -39.05,-17.75 -39.05,-4.25 -59.05,-4.25 ; -59.05,-17.75 -59.05,-4.25 ; -59.05,-17.75 -49.05,-11 -59.05,-4.25 ; -59.05,4.25 -59.05,17.75 ; -59.05,4.25 -39.05,4.25 -39.05,17.75 -59.05,17.75 ; -59.05,4.25 -49.05,11 -59.05,17.75 ; -30.75,-10 30.75,-10 30.75,0 ; 59.05,-17.75 39.05,-17.75 39.05,-4.25 59.05,-4.25 ; 59.05,-17.75 59.05,-4.25 ; 59.05,-17.75 49.05,-11 59.05,-4.25 ; 59.05,4.25 39.05,4.25 39.05,17.75 59.05,17.75 ; 59.05,4.25 59.05,17.75 ; 59.05,4.25 49.05,11 59.05,17.75
Mechanical 14:
  circle w0.1: c-38.5,25 r3.4
  circle w0.1: c-38.5,25 r2.7
  circle w0.1: c38.5,25 r3.4
  circle w0.1: c38.5,25 r2.7
  circle w0.1: c38.5,-25 r3.4
  circle w0.1: c38.5,-25 r2.7
  circle w0.1: c-38.5,-25 r3.4
  circle w0.1: c-38.5,-25 r2.7
  lines w0.1: -53.5,-19.5 -53.5,-2.8 ; -53.5,2.8 -53.5,19.5 ; -46.5,-19.5 -58.5,-19.5 -58.5,-2.8 -46.5,-2.8 ; -46.5,2.8 -58.5,2.8 -58.5,19.5 -46.5,19.5 ; 46.5,-19.5 58.5,-19.5 58.5,-2.8 46.5,-2.8 ; 46.5,2.8 58.5,2.8 58.5,19.5 46.5,19.5 ; 53.5,-19.5 53.5,-2.8 ; 53.5,2.8 53.5,19.5 ; -58.05,-16.75 -40.05,-16.75 -40.05,-5.25 -58.05,-5.25 -58.05,-16.75 ; -58.05,5.25 -58.05,16.75 -40.05,16.75 -40.05,5.25 -58.05,5.25 ; -46.5,-25 ccw(c-38.5,-25) -45.092,-29.533 ccw(c-40.972,-26.7) -40.972,-31.7 -36.68,-31.7 ccw(c-36.68,-26.7) -32.954,-30.033 cw(c-25.5,-36.7) -25.5,-26.7 25.5,-26.7 cw(c25.5,-36.7) 32.954,-30.033 ccw(c36.68,-26.7) 36.68,-31.7 40.972,-31.7 ccw(c40.972,-26.7) 45.092,-29.533 ccw(c38.5,-25) 46.5,-25 46.5,25 ccw(c38.5,25) 45.092,29.533 ccw(c40.972,26.7) 40.972,31.7 36.68,31.7 ccw(c36.68,26.7) 32.954,30.033 cw(c25.5,36.7) 25.5,26.7 -25.5,26.7 cw(c-25.5,36.7) -32.954,30.033 ccw(c-36.68,26.7) -36.68,31.7 -40.972,31.7 ccw(c-40.972,26.7) -45.092,29.533 ccw(c-38.5,25) -46.5,25 -46.5,-25 ; -44.45,-24.8 -44.45,24.8 -41.994,24.8 ccw(c-38.5,25) -35.006,24.8 35.006,24.8 ccw(c38.5,25) 41.994,24.8 44.45,24.8 44.45,-24.8 41.994,-24.8 ccw(c38.5,-24.992) 35.006,-24.8 -35.006,-24.8 ccw(c-38.5,-25) -41.994,-24.8 -44.45,-24.8 ; 40.05,-16.75 40.05,-5.25 58.05,-5.25 58.05,-16.75 40.05,-16.75 ; 40.05,5.25 40.05,16.75 58.05,16.75 58.05,5.25 40.05,5.25
  text "9" at -29.8,-5.075 h2
  text "3" at 35.975,-12.3 h3
  text "4" at 35.952,9.5 h3
  text "1" at -37.413,-12.4 h3
  text "2" at -37.5,9.5 h3
  text "6" at 25.25,11.925 h2
  text "5" at 20.75,11.925 h2
  text "8" at -18.259,11.925 h2
  text "7" at -22.81,11.925 h2
3D body "SEMIKRON_SEMIX 2S.stp": height 17.5, standoff -5.5, extent -58.5,-31.7 58.5,31.7